# Altium schematic symbol library jlcpcb_2025_04_capacitors_extended_0805.schlib: 3281 symbols (part 11 of 18) (continued)
## CGA4J2X7R2A104KT0Y0U
designator C?  Capacitance: 100nF  (hidden comment: *)
Capacitor, Ceramic (MLCC), 100nF, ±10%, 100V, X7R, ±10%, SMD 0805; Manufacturer: TDK; Manufacturer Part Number: CGA4J2X7R2A104KT0Y0U; Package Size: 0805; JLCPCB Basic Part: No; JLCPCB Part Number: C342919; Supplier 1: LCSC; Category: Capacitors - MLCC; Supplier Part Number 1: C342919; Tolerance: ±10%; Voltage Rating: 100V; Temperature Coefficient: X7R; RoHS: Yes; ComponentLink1Description: Datasheet; ComponentLink1URL: https://wmsc.lcsc.com/wmsc/upload/file/pdf/v2/lcsc/2304140030_TDK-CGA4J2X7R2A104KT0Y0U_C342919.pdf; ComponentLink2Description: JLCPCB Part URL; ComponentLink2URL: https://jlcpcb.com/partdetail/C342919; ComponentLink3Description: LCSC Part URL; ComponentLink3URL: https://lcsc.com/product-detail/Multilayer-Ceramic-Capacitors-MLCC---SMD-SMT_TDK-TDK-CGA4J2X7R2A104KT0Y0U_C342919.html
footprint CAP-0805 (0805 (2012M) Capacitor)
pins: 1, 2

## CGA4J2X7R2A223KT0Y0U
designator C?  Capacitance: 22nF  (hidden comment: *)
Capacitor, Ceramic (MLCC), 22nF, ±10%, 100V, X7R, ±10%, SMD 0805; Manufacturer: TDK; Manufacturer Part Number: CGA4J2X7R2A223KT0Y0U; Package Size: 0805; JLCPCB Basic Part: No; JLCPCB Part Number: C338065; Supplier 1: LCSC; Category: Capacitors - MLCC; Supplier Part Number 1: C338065; Tolerance: ±10%; Voltage Rating: 100V; Temperature Coefficient: X7R; RoHS: Yes; ComponentLink1Description: Datasheet; ComponentLink1URL: https://wmsc.lcsc.com/wmsc/upload/file/pdf/v2/lcsc/2304140030_TDK-CGA4J2X7R2A223KT0Y0U_C338065.pdf; ComponentLink2Description: JLCPCB Part URL; ComponentLink2URL: https://jlcpcb.com/partdetail/C338065; ComponentLink3Description: LCSC Part URL; ComponentLink3URL: https://lcsc.com/product-detail/Multilayer-Ceramic-Capacitors-MLCC---SMD-SMT_TDK-TDK-CGA4J2X7R2A223KT0Y0U_C338065.html
footprint CAP-0805 (0805 (2012M) Capacitor)
pins: 1, 2

## CGA4J2X7R2A473KT0Y0U
designator C?  Capacitance: 47nF  (hidden comment: *)
Capacitor, Ceramic (MLCC), 47nF, ±10%, 100V, X7R, ±10%, SMD 0805; Manufacturer: TDK; Manufacturer Part Number: CGA4J2X7R2A473KT0Y0U; Package Size: 0805; JLCPCB Basic Part: No; JLCPCB Part Number: C342887; Supplier 1: LCSC; Category: Capacitors - MLCC; Supplier Part Number 1: C342887; Tolerance: ±10%; Voltage Rating: 100V; Temperature Coefficient: X7R; RoHS: Yes; ComponentLink1Description: Datasheet; ComponentLink1URL: https://wmsc.lcsc.com/wmsc/upload/file/pdf/v2/lcsc/2304140030_TDK-CGA4J2X7R2A473KT0Y0U_C342887.pdf; ComponentLink2Description: JLCPCB Part URL; ComponentLink2URL: https://jlcpcb.com/partdetail/C342887; ComponentLink3Description: LCSC Part URL; ComponentLink3URL: https://lcsc.com/product-detail/Multilayer-Ceramic-Capacitors-MLCC---SMD-SMT_TDK-TDK-CGA4J2X7R2A473KT0Y0U_C342887.html
footprint CAP-0805 (0805 (2012M) Capacitor)
pins: 1, 2

## CGA4J2X8R1H104KT0Y0H
designator C?  Capacitance: 100nF  (hidden comment: *)
Capacitor, Ceramic (MLCC), 100nF, ±10%, 50V, X8R, ±10%, SMD 0805; Manufacturer: TDK; Manufacturer Part Number: CGA4J2X8R1H104KT0Y0H; Package Size: 0805; JLCPCB Basic Part: No; JLCPCB Part Number: C342862; Supplier 1: LCSC; Category: Capacitors - MLCC; Supplier Part Number 1: C342862; Tolerance: ±10%; Voltage Rating: 50V; Temperature Coefficient: X8R; RoHS: Yes; ComponentLink1Description: Datasheet; ComponentLink1URL: https://wmsc.lcsc.com/wmsc/upload/file/pdf/v2/lcsc/2304140030_TDK-CGA4J2X8R1H104KT0Y0H_C342862.pdf; ComponentLink2Description: JLCPCB Part URL; ComponentLink2URL: https://jlcpcb.com/partdetail/C342862; ComponentLink3Description: LCSC Part URL; ComponentLink3URL: https://lcsc.com/product-detail/Multilayer-Ceramic-Capacitors-MLCC---SMD-SMT_TDK-TDK-CGA4J2X8R1H104KT0Y0H_C342862.html
footprint CAP-0805 (0805 (2012M) Capacitor)
pins: 1, 2

## CGA4J3C0G2E103JT0Y0N
designator C?  Capacitance: 10nF  (hidden comment: *)
Capacitor, Ceramic (MLCC), 10nF, ±5%, 250V, C0G, ±5%, SMD 0805; Manufacturer: TDK; Manufacturer Part Number: CGA4J3C0G2E103JT0Y0N; Package Size: 0805; JLCPCB Basic Part: No; JLCPCB Part Number: C193080; Supplier 1: LCSC; Category: Capacitors - MLCC; Supplier Part Number 1: C193080; Tolerance: ±5%; Voltage Rating: 250V; Temperature Coefficient: C0G; RoHS: Yes; ComponentLink1Description: Datasheet; ComponentLink1URL: https://wmsc.lcsc.com/wmsc/upload/file/pdf/v2/lcsc/2304140030_TDK-CGA4J3C0G2E103JT0Y0N_C193080.pdf; ComponentLink2Description: JLCPCB Part URL; ComponentLink2URL: https://jlcpcb.com/partdetail/C193080; ComponentLink3Description: LCSC Part URL; ComponentLink3URL: https://lcsc.com/product-detail/Multilayer-Ceramic-Capacitors-MLCC---SMD-SMT_TDK-TDK-CGA4J3C0G2E103JT0Y0N_C193080.html
footprint CAP-0805 (0805 (2012M) Capacitor)
pins: 1, 2

## CGA4J3C0G2E222JT0Y0N
designator C?  Capacitance: 2.2nF  (hidden comment: *)
Capacitor, Ceramic (MLCC), 2.2nF, ±5%, 250V, C0G, ±5%, SMD 0805; Manufacturer: TDK; Manufacturer Part Number: CGA4J3C0G2E222JT0Y0N; Package Size: 0805; JLCPCB Basic Part: No; JLCPCB Part Number: C694233; Supplier 1: LCSC; Category: Capacitors - MLCC; Supplier Part Number 1: C694233; Tolerance: ±5%; Voltage Rating: 250V; Temperature Coefficient: C0G; RoHS: Yes; ComponentLink1Description: Datasheet; ComponentLink1URL: https://wmsc.lcsc.com/wmsc/upload/file/pdf/v2/lcsc/2304140030_TDK-CGA4J3C0G2E222JT0Y0N_C694233.pdf; ComponentLink2Description: JLCPCB Part URL; ComponentLink2URL: https://jlcpcb.com/partdetail/C694233; ComponentLink3Description: LCSC Part URL; ComponentLink3URL: https://lcsc.com/product-detail/Multilayer-Ceramic-Capacitors-MLCC---SMD-SMT_TDK-TDK-CGA4J3C0G2E222JT0Y0N_C694233.html
footprint CAP-0805 (0805 (2012M) Capacitor)
pins: 1, 2

## CGA4J3C0G2E472JT0Y0N
designator C?  Capacitance: 4.7nF  (hidden comment: *)
Capacitor, Ceramic (MLCC), 4.7nF, ±5%, 250V, C0G, ±5%, SMD 0805; Manufacturer: TDK; Manufacturer Part Number: CGA4J3C0G2E472JT0Y0N; Package Size: 0805; JLCPCB Basic Part: No; JLCPCB Part Number: C415305; Supplier 1: LCSC; Category: Capacitors - MLCC; Supplier Part Number 1: C415305; Tolerance: ±5%; Voltage Rating: 250V; Temperature Coefficient: C0G; RoHS: Yes; ComponentLink1Description: Datasheet; ComponentLink1URL: https://wmsc.lcsc.com/wmsc/upload/file/pdf/v2/lcsc/2304140030_TDK-CGA4J3C0G2E472JT0Y0N_C415305.pdf; ComponentLink2Description: JLCPCB Part URL; ComponentLink2URL: https://jlcpcb.com/partdetail/C415305; ComponentLink3Description: LCSC Part URL; ComponentLink3URL: https://lcsc.com/product-detail/Multilayer-Ceramic-Capacitors-MLCC---SMD-SMT_TDK-TDK-CGA4J3C0G2E472JT0Y0N_C415305.html
footprint CAP-0805 (0805 (2012M) Capacitor)
pins: 1, 2

## CGA4J3C0G2E682JT0Y0N
designator C?  Capacitance: 6.8nF  (hidden comment: *)
Capacitor, Ceramic (MLCC), 6.8nF, ±5%, 250V, null, ±5%, SMD 0805; Manufacturer: TDK; Manufacturer Part Number: CGA4J3C0G2E682JT0Y0N; Package Size: 0805; JLCPCB Basic Part: No; JLCPCB Part Number: C5213809; Supplier 1: LCSC; Category: Capacitors - MLCC; Supplier Part Number 1: C5213809; Tolerance: ±5%; Voltage Rating: 250V; Temperature Coefficient: null; RoHS: Yes; ComponentLink1Description: Datasheet; ComponentLink1URL: https://wmsc.lcsc.com/wmsc/upload/file/pdf/v2/lcsc/2210261730_TDK-CGA4J3C0G2E682JT0Y0N_C5213809.pdf; ComponentLink2Description: JLCPCB Part URL; ComponentLink2URL: https://jlcpcb.com/partdetail/C5213809; ComponentLink3Description: LCSC Part URL; ComponentLink3URL: https://lcsc.com/product-detail/Multilayer-Ceramic-Capacitors-MLCC---SMD-SMT_TDK-TDK-CGA4J3C0G2E682JT0Y0N_C5213809.html
footprint CAP-0805 (0805 (2012M) Capacitor)
pins: 1, 2

## CGA4J3X5R1A106KT0Y0N
designator C?  Capacitance: 10uF  (hidden comment: *)
Capacitor, Ceramic (MLCC), 10uF, ±10%, 10V, X5R, ±10%, SMD 0805; Manufacturer: TDK; Manufacturer Part Number: CGA4J3X5R1A106KT0Y0N; Package Size: 0805; JLCPCB Basic Part: No; JLCPCB Part Number: C193117; Supplier 1: LCSC; Category: Capacitors - MLCC; Supplier Part Number 1: C193117; Tolerance: ±10%; Voltage Rating: 10V; Temperature Coefficient: X5R; RoHS: Yes; ComponentLink1Description: Datasheet; ComponentLink1URL: https://wmsc.lcsc.com/wmsc/upload/file/pdf/v2/lcsc/2304140030_TDK-CGA4J3X5R1A106KT0Y0N_C193117.pdf; ComponentLink2Description: JLCPCB Part URL; ComponentLink2URL: https://jlcpcb.com/partdetail/C193117; ComponentLink3Description: LCSC Part URL; ComponentLink3URL: https://lcsc.com/product-detail/Multilayer-Ceramic-Capacitors-MLCC---SMD-SMT_TDK-TDK-CGA4J3X5R1A106KT0Y0N_C193117.html
footprint CAP-0805 (0805 (2012M) Capacitor)
pins: 1, 2

## CGA4J3X5R1E225KT0Y0N
designator C?  Capacitance: 2.2uF  (hidden comment: *)
Capacitor, Ceramic (MLCC), 2.2uF, ±10%, 25V, ±10%, SMD 0805; Manufacturer: TDK; Manufacturer Part Number: CGA4J3X5R1E225KT0Y0N; Package Size: 0805; JLCPCB Basic Part: No; JLCPCB Part Number: C2838753; Supplier 1: LCSC; Category: Capacitors - MLCC; Supplier Part Number 1: C2838753; Tolerance: ±10%; Voltage Rating: 25V; RoHS: Yes; ComponentLink1Description: Datasheet; ComponentLink1URL: https://wmsc.lcsc.com/wmsc/upload/file/pdf/v2/lcsc/2108071730_TDK-CGA4J3X5R1E225KT0Y0N_C2838753.pdf; ComponentLink2Description: JLCPCB Part URL; ComponentLink2URL: https://jlcpcb.com/partdetail/C2838753; ComponentLink3Description: LCSC Part URL; ComponentLink3URL: https://lcsc.com/product-detail/Multilayer-Ceramic-Capacitors-MLCC---SMD-SMT_TDK-TDK-CGA4J3X5R1E225KT0Y0N_C2838753.html
footprint CAP-0805 (0805 (2012M) Capacitor)
pins: 1, 2

## CGA4J3X5R1E475KT0Y0N
designator C?  Capacitance: 4.7uF  (hidden comment: *)
Capacitor, Ceramic (MLCC), 4.7uF, ±10%, 25V, X5R, ±10%, SMD 0805; Manufacturer: TDK; Manufacturer Part Number: CGA4J3X5R1E475KT0Y0N; Package Size: 0805; JLCPCB Basic Part: No; JLCPCB Part Number: C193078; Supplier 1: LCSC; Category: Capacitors - MLCC; Supplier Part Number 1: C193078; Tolerance: ±10%; Voltage Rating: 25V; Temperature Coefficient: X5R; RoHS: Yes; ComponentLink1Description: Datasheet; ComponentLink1URL: https://wmsc.lcsc.com/wmsc/upload/file/pdf/v2/lcsc/2304140030_TDK-CGA4J3X5R1E475KT0Y0N_C193078.pdf; ComponentLink2Description: JLCPCB Part URL; ComponentLink2URL: https://jlcpcb.com/partdetail/C193078; ComponentLink3Description: LCSC Part URL; ComponentLink3URL: https://lcsc.com/product-detail/Multilayer-Ceramic-Capacitors-MLCC---SMD-SMT_TDK-TDK-CGA4J3X5R1E475KT0Y0N_C193078.html
footprint CAP-0805 (0805 (2012M) Capacitor)
pins: 1, 2

## CGA4J3X5R1H335KT0Y0N
designator C?  Capacitance: 3.3uF  (hidden comment: *)
Capacitor, Ceramic (MLCC), 3.3uF, ±10%, 50V, X5R, ±10%, SMD 0805; Manufacturer: TDK; Manufacturer Part Number: CGA4J3X5R1H335KT0Y0N; Package Size: 0805; JLCPCB Basic Part: No; JLCPCB Part Number: C2939047; Supplier 1: LCSC; Category: Capacitors - MLCC; Supplier Part Number 1: C2939047; Tolerance: ±10%; Voltage Rating: 50V; Temperature Coefficient: X5R; RoHS: Yes; ComponentLink1Description: Datasheet; ComponentLink1URL: https://wmsc.lcsc.com/wmsc/upload/file/pdf/v2/lcsc/2201121830_TDK-CGA4J3X5R1H335KT0Y0N_C2939047.pdf; ComponentLink2Description: JLCPCB Part URL; ComponentLink2URL: https://jlcpcb.com/partdetail/C2939047; ComponentLink3Description: LCSC Part URL; ComponentLink3URL: https://lcsc.com/product-detail/Multilayer-Ceramic-Capacitors-MLCC---SMD-SMT_TDK-TDK-CGA4J3X5R1H335KT0Y0N_C2939047.html
footprint CAP-0805 (0805 (2012M) Capacitor)
pins: 1, 2

## CGA4J3X5R1H475KT0Y0N
designator C?  Capacitance: 4.7uF  (hidden comment: *)
Capacitor, Ceramic (MLCC), 4.7uF, ±10%, 50V, X5R, ±10%, SMD 0805; Manufacturer: TDK; Manufacturer Part Number: CGA4J3X5R1H475KT0Y0N; Package Size: 0805; JLCPCB Basic Part: No; JLCPCB Part Number: C329962; Supplier 1: LCSC; Category: Capacitors - MLCC; Supplier Part Number 1: C329962; Tolerance: ±10%; Voltage Rating: 50V; Temperature Coefficient: X5R; RoHS: Yes; ComponentLink1Description: Datasheet; ComponentLink1URL: https://wmsc.lcsc.com/wmsc/upload/file/pdf/v2/lcsc/2304140030_TDK-CGA4J3X5R1H475KT0Y0N_C329962.pdf; ComponentLink2Description: JLCPCB Part URL; ComponentLink2URL: https://jlcpcb.com/partdetail/C329962; ComponentLink3Description: LCSC Part URL; ComponentLink3URL: https://lcsc.com/product-detail/Multilayer-Ceramic-Capacitors-MLCC---SMD-SMT_TDK-TDK-CGA4J3X5R1H475KT0Y0N_C329962.html
footprint CAP-0805 (0805 (2012M) Capacitor)
pins: 1, 2

## CGA4J3X7R1A475KT0Y0N
designator C?  Capacitance: 4.7uF  (hidden comment: *)
Capacitor, Ceramic (MLCC), 4.7uF, ±10%, 10V, X7R, ±10%, SMD 0805; Manufacturer: TDK; Manufacturer Part Number: CGA4J3X7R1A475KT0Y0N; Package Size: 0805; JLCPCB Basic Part: No; JLCPCB Part Number: C193119; Supplier 1: LCSC; Category: Capacitors - MLCC; Supplier Part Number 1: C193119; Tolerance: ±10%; Voltage Rating: 10V; Temperature Coefficient: X7R; RoHS: Yes; ComponentLink1Description: Datasheet; ComponentLink1URL: https://wmsc.lcsc.com/wmsc/upload/file/pdf/v2/lcsc/2304140030_TDK-CGA4J3X7R1A475KT0Y0N_C193119.pdf; ComponentLink2Description: JLCPCB Part URL; ComponentLink2URL: https://jlcpcb.com/partdetail/C193119; ComponentLink3Description: LCSC Part URL; ComponentLink3URL: https://lcsc.com/product-detail/Multilayer-Ceramic-Capacitors-MLCC---SMD-SMT_TDK-TDK-CGA4J3X7R1A475KT0Y0N_C193119.html
footprint CAP-0805 (0805 (2012M) Capacitor)
pins: 1, 2

## CGA4J3X7R1C225K125AB
designator C?  Capacitance: 2.2uF  (hidden comment: *)
Capacitor, Ceramic (MLCC), 2.2uF, ±10%, 16V, X7R, ±10%, SMD 0805; Manufacturer: TDK; Manufacturer Part Number: CGA4J3X7R1C225K125AB; Package Size: 0805; JLCPCB Basic Part: No; JLCPCB Part Number: C183896; Supplier 1: LCSC; Category: Capacitors - MLCC; Supplier Part Number 1: C183896; Tolerance: ±10%; Voltage Rating: 16V; Temperature Coefficient: X7R; RoHS: Yes; ComponentLink1Description: Datasheet; ComponentLink1URL: https://wmsc.lcsc.com/wmsc/upload/file/pdf/v2/lcsc/2304140030_TDK-CGA4J3X7R1C225K125AB_C183896.pdf; ComponentLink2Description: JLCPCB Part URL; ComponentLink2URL: https://jlcpcb.com/partdetail/C183896; ComponentLink3Description: LCSC Part URL; ComponentLink3URL: https://lcsc.com/product-detail/Multilayer-Ceramic-Capacitors-MLCC---SMD-SMT_TDK-TDK-CGA4J3X7R1C225K125AB_C183896.html
footprint CAP-0805 (0805 (2012M) Capacitor)
pins: 1, 2

## CGA4J3X7R1C225KT0Y0N
designator C?  Capacitance: 2.2uF  (hidden comment: *)
Capacitor, Ceramic (MLCC), 2.2uF, ±10%, 16V, X7R, ±10%, SMD 0805; Manufacturer: TDK; Manufacturer Part Number: CGA4J3X7R1C225KT0Y0N; Package Size: 0805; JLCPCB Basic Part: No; JLCPCB Part Number: C338060; Supplier 1: LCSC; Category: Capacitors - MLCC; Supplier Part Number 1: C338060; Tolerance: ±10%; Voltage Rating: 16V; Temperature Coefficient: X7R; RoHS: Yes; ComponentLink1Description: Datasheet; ComponentLink1URL: https://wmsc.lcsc.com/wmsc/upload/file/pdf/v2/lcsc/2304140030_TDK-CGA4J3X7R1C225KT0Y0N_C338060.pdf; ComponentLink2Description: JLCPCB Part URL; ComponentLink2URL: https://jlcpcb.com/partdetail/C338060; ComponentLink3Description: LCSC Part URL; ComponentLink3URL: https://lcsc.com/product-detail/Multilayer-Ceramic-Capacitors-MLCC---SMD-SMT_TDK-TDK-CGA4J3X7R1C225KT0Y0N_C338060.html
footprint CAP-0805 (0805 (2012M) Capacitor)
pins: 1, 2

## CGA4J3X7R1C335KT0Y0N
designator C?  Capacitance: 3.3uF  (hidden comment: *)
Capacitor, Ceramic (MLCC), 3.3uF, ±10%, 16V, X7R, ±10%, SMD 0805; Manufacturer: TDK; Manufacturer Part Number: CGA4J3X7R1C335KT0Y0N; Package Size: 0805; JLCPCB Basic Part: No; JLCPCB Part Number: C415306; Supplier 1: LCSC; Category: Capacitors - MLCC; Supplier Part Number 1: C415306; Tolerance: ±10%; Voltage Rating: 16V; Temperature Coefficient: X7R; RoHS: Yes; ComponentLink1Description: Datasheet; ComponentLink1URL: https://wmsc.lcsc.com/wmsc/upload/file/pdf/v2/lcsc/2304140030_TDK-CGA4J3X7R1C335KT0Y0N_C415306.pdf; ComponentLink2Description: JLCPCB Part URL; ComponentLink2URL: https://jlcpcb.com/partdetail/C415306; ComponentLink3Description: LCSC Part URL; ComponentLink3URL: https://lcsc.com/product-detail/Multilayer-Ceramic-Capacitors-MLCC---SMD-SMT_TDK-TDK-CGA4J3X7R1C335KT0Y0N_C415306.html
footprint CAP-0805 (0805 (2012M) Capacitor)
pins: 1, 2

## CGA4J3X7R1C475KT0Y0N
designator C?  Capacitance: 4.7uF  (hidden comment: *)
Capacitor, Ceramic (MLCC), 4.7uF, ±10%, 16V, X7R, ±10%, SMD 0805; Manufacturer: TDK; Manufacturer Part Number: CGA4J3X7R1C475KT0Y0N; Package Size: 0805; JLCPCB Basic Part: No; JLCPCB Part Number: C342757; Supplier 1: LCSC; Category: Capacitors - MLCC; Supplier Part Number 1: C342757; Tolerance: ±10%; Voltage Rating: 16V; Temperature Coefficient: X7R; RoHS: Yes; ComponentLink1Description: Datasheet; ComponentLink1URL: https://wmsc.lcsc.com/wmsc/upload/file/pdf/v2/lcsc/2304140030_TDK-CGA4J3X7R1C475KT0Y0N_C342757.pdf; ComponentLink2Description: JLCPCB Part URL; ComponentLink2URL: https://jlcpcb.com/partdetail/C342757; ComponentLink3Description: LCSC Part URL; ComponentLink3URL: https://lcsc.com/product-detail/Multilayer-Ceramic-Capacitors-MLCC---SMD-SMT_TDK-TDK-CGA4J3X7R1C475KT0Y0N_C342757.html
footprint CAP-0805 (0805 (2012M) Capacitor)
pins: 1, 2

## CGA4J3X7R1C475KT0Y0S
designator C?  Capacitance: 4.7uF  (hidden comment: *)
Capacitor, Ceramic (MLCC), 4.7uF, ±10%, 16V, X7R, ±10%, SMD 0805; Manufacturer: TDK; Manufacturer Part Number: CGA4J3X7R1C475KT0Y0S; Package Size: 0805; JLCPCB Basic Part: No; JLCPCB Part Number: C415307; Supplier 1: LCSC; Category: Capacitors - MLCC; Supplier Part Number 1: C415307; Tolerance: ±10%; Voltage Rating: 16V; Temperature Coefficient: X7R; RoHS: Yes; ComponentLink1Description: Datasheet; ComponentLink1URL: https://wmsc.lcsc.com/wmsc/upload/file/pdf/v2/lcsc/2304140030_TDK-CGA4J3X7R1C475KT0Y0S_C415307.pdf; ComponentLink2Description: JLCPCB Part URL; ComponentLink2URL: https://jlcpcb.com/partdetail/C415307; ComponentLink3Description: LCSC Part URL; ComponentLink3URL: https://lcsc.com/product-detail/Multilayer-Ceramic-Capacitors-MLCC---SMD-SMT_TDK-TDK-CGA4J3X7R1C475KT0Y0S_C415307.html
footprint CAP-0805 (0805 (2012M) Capacitor)
pins: 1, 2

## CGA4J3X7R1E105KT0Y0N
designator C?  Capacitance: 1uF  (hidden comment: *)
Capacitor, Ceramic (MLCC), 1uF, ±10%, 25V, X7R, ±10%, SMD 0805; Manufacturer: TDK; Manufacturer Part Number: CGA4J3X7R1E105KT0Y0N; Package Size: 0805; JLCPCB Basic Part: No; JLCPCB Part Number: C342927; Supplier 1: LCSC; Category: Capacitors - MLCC; Supplier Part Number 1: C342927; Tolerance: ±10%; Voltage Rating: 25V; Temperature Coefficient: X7R; RoHS: Yes; ComponentLink1Description: Datasheet; ComponentLink1URL: https://wmsc.lcsc.com/wmsc/upload/file/pdf/v2/lcsc/2304140030_TDK-CGA4J3X7R1E105KT0Y0N_C342927.pdf; ComponentLink2Description: JLCPCB Part URL; ComponentLink2URL: https://jlcpcb.com/partdetail/C342927; ComponentLink3Description: LCSC Part URL; ComponentLink3URL: https://lcsc.com/product-detail/Multilayer-Ceramic-Capacitors-MLCC---SMD-SMT_TDK-TDK-CGA4J3X7R1E105KT0Y0N_C342927.html
footprint CAP-0805 (0805 (2012M) Capacitor)
pins: 1, 2

## CGA4J3X7R1E225KT0Y0N
designator C?  Capacitance: 2.2uF  (hidden comment: *)
Capacitor, Ceramic (MLCC), 2.2uF, ±10%, 25V, X7R, ±10%, SMD 0805; Manufacturer: TDK; Manufacturer Part Number: CGA4J3X7R1E225KT0Y0N; Package Size: 0805; JLCPCB Basic Part: No; JLCPCB Part Number: C76714; Supplier 1: LCSC; Category: Capacitors - MLCC; Supplier Part Number 1: C76714; Tolerance: ±10%; Voltage Rating: 25V; Temperature Coefficient: X7R; RoHS: Yes; ComponentLink1Description: Datasheet; ComponentLink1URL: https://wmsc.lcsc.com/wmsc/upload/file/pdf/v2/lcsc/2304140030_TDK-CGA4J3X7R1E225KT0Y0N_C76714.pdf; ComponentLink2Description: JLCPCB Part URL; ComponentLink2URL: https://jlcpcb.com/partdetail/C76714; ComponentLink3Description: LCSC Part URL; ComponentLink3URL: https://lcsc.com/product-detail/Multilayer-Ceramic-Capacitors-MLCC---SMD-SMT_TDK-TDK-CGA4J3X7R1E225KT0Y0N_C76714.html
footprint CAP-0805 (0805 (2012M) Capacitor)
pins: 1, 2

## CGA4J3X7R1E684KT0Y0N
designator C?  Capacitance: 680nF  (hidden comment: *)
Capacitor, Ceramic (MLCC), 680nF, ±10%, 25V, X7R, ±10%, SMD 0805; Manufacturer: TDK; Manufacturer Part Number: CGA4J3X7R1E684KT0Y0N; Package Size: 0805; JLCPCB Basic Part: No; JLCPCB Part Number: C360358; Supplier 1: LCSC; Category: Capacitors - MLCC; Supplier Part Number 1: C360358; Tolerance: ±10%; Voltage Rating: 25V; Temperature Coefficient: X7R; RoHS: Yes; ComponentLink1Description: Datasheet; ComponentLink1URL: https://wmsc.lcsc.com/wmsc/upload/file/pdf/v2/lcsc/2304140030_TDK-CGA4J3X7R1E684KT0Y0N_C360358.pdf; ComponentLink2Description: JLCPCB Part URL; ComponentLink2URL: https://jlcpcb.com/partdetail/C360358; ComponentLink3Description: LCSC Part URL; ComponentLink3URL: https://lcsc.com/product-detail/Multilayer-Ceramic-Capacitors-MLCC---SMD-SMT_TDK-TDK-CGA4J3X7R1E684KT0Y0N_C360358.html
footprint CAP-0805 (0805 (2012M) Capacitor)
pins: 1, 2

## CGA4J3X7R1H105KT0Y0N
designator C?  Capacitance: 1uF  (hidden comment: *)
Capacitor, Ceramic (MLCC), 1uF, ±10%, 50V, X7R, ±10%, SMD 0805; Manufacturer: TDK; Manufacturer Part Number: CGA4J3X7R1H105KT0Y0N; Package Size: 0805; JLCPCB Basic Part: No; JLCPCB Part Number: C342759; Supplier 1: LCSC; Category: Capacitors - MLCC; Supplier Part Number 1: C342759; Tolerance: ±10%; Voltage Rating: 50V; Temperature Coefficient: X7R; RoHS: Yes; ComponentLink1Description: Datasheet; ComponentLink1URL: https://wmsc.lcsc.com/wmsc/upload/file/pdf/v2/lcsc/2304140030_TDK-CGA4J3X7R1H105KT0Y0N_C342759.pdf; ComponentLink2Description: JLCPCB Part URL; ComponentLink2URL: https://jlcpcb.com/partdetail/C342759; ComponentLink3Description: LCSC Part URL; ComponentLink3URL: https://lcsc.com/product-detail/Multilayer-Ceramic-Capacitors-MLCC---SMD-SMT_TDK-TDK-CGA4J3X7R1H105KT0Y0N_C342759.html
footprint CAP-0805 (0805 (2012M) Capacitor)
pins: 1, 2

## CGA4J3X7R1H225KT000N
designator C?  Capacitance: 2.2uF  (hidden comment: *)
Capacitor, Ceramic (MLCC), 2.2uF, ±10%, 50V, X7R, ±10%, SMD 0805; Manufacturer: TDK; Manufacturer Part Number: CGA4J3X7R1H225KT000N; Package Size: 0805; JLCPCB Basic Part: No; JLCPCB Part Number: C342737; Supplier 1: LCSC; Category: Capacitors - MLCC; Supplier Part Number 1: C342737; Tolerance: ±10%; Voltage Rating: 50V; Temperature Coefficient: X7R; RoHS: Yes; ComponentLink1Description: Datasheet; ComponentLink1URL: https://wmsc.lcsc.com/wmsc/upload/file/pdf/v2/lcsc/2304140030_TDK-CGA4J3X7R1H225KT000N_C342737.pdf; ComponentLink2Description: JLCPCB Part URL; ComponentLink2URL: https://jlcpcb.com/partdetail/C342737; ComponentLink3Description: LCSC Part URL; ComponentLink3URL: https://lcsc.com/product-detail/Multilayer-Ceramic-Capacitors-MLCC---SMD-SMT_TDK-TDK-CGA4J3X7R1H225KT000N_C342737.html
footprint CAP-0805 (0805 (2012M) Capacitor)
pins: 1, 2

## CGA4J3X7R1H474KT0Y0N
designator C?  Capacitance: 470nF  (hidden comment: *)
Capacitor, Ceramic (MLCC), 470nF, ±10%, 50V, X7R, ±10%, SMD 0805; Manufacturer: TDK; Manufacturer Part Number: CGA4J3X7R1H474KT0Y0N; Package Size: 0805; JLCPCB Basic Part: No; JLCPCB Part Number: C342804; Supplier 1: LCSC; Category: Capacitors - MLCC; Supplier Part Number 1: C342804; Tolerance: ±10%; Voltage Rating: 50V; Temperature Coefficient: X7R; RoHS: Yes; ComponentLink1Description: Datasheet; ComponentLink1URL: https://wmsc.lcsc.com/wmsc/upload/file/pdf/v2/lcsc/2304140030_TDK-CGA4J3X7R1H474KT0Y0N_C342804.pdf; ComponentLink2Description: JLCPCB Part URL; ComponentLink2URL: https://jlcpcb.com/partdetail/C342804; ComponentLink3Description: LCSC Part URL; ComponentLink3URL: https://lcsc.com/product-detail/Multilayer-Ceramic-Capacitors-MLCC---SMD-SMT_TDK-TDK-CGA4J3X7R1H474KT0Y0N_C342804.html
footprint CAP-0805 (0805 (2012M) Capacitor)
pins: 1, 2

## CGA4J3X7R1H474KT0Y0S
designator C?  Capacitance: 470nF  (hidden comment: *)
Capacitor, Ceramic (MLCC), 470nF, ±10%, 50V, X7R, ±10%, SMD 0805; Manufacturer: TDK; Manufacturer Part Number: CGA4J3X7R1H474KT0Y0S; Package Size: 0805; JLCPCB Basic Part: No; JLCPCB Part Number: C415308; Supplier 1: LCSC; Category: Capacitors - MLCC; Supplier Part Number 1: C415308; Tolerance: ±10%; Voltage Rating: 50V; Temperature Coefficient: X7R; RoHS: Yes; ComponentLink1Description: Datasheet; ComponentLink1URL: https://wmsc.lcsc.com/wmsc/upload/file/pdf/v2/lcsc/1912111437_TDK-CGA4J3X7R1H474KT0Y0S_C415308.pdf; ComponentLink2Description: JLCPCB Part URL; ComponentLink2URL: https://jlcpcb.com/partdetail/C415308; ComponentLink3Description: LCSC Part URL; ComponentLink3URL: https://lcsc.com/product-detail/Multilayer-Ceramic-Capacitors-MLCC---SMD-SMT_TDK-TDK-CGA4J3X7R1H474KT0Y0S_C415308.html
footprint CAP-0805 (0805 (2012M) Capacitor)
pins: 1, 2

## CGA4J3X7R1H684KT0Y0N
designator C?  Capacitance: 680nF  (hidden comment: *)
Capacitor, Ceramic (MLCC), 680nF, ±10%, 50V, X7R, ±10%, SMD 0805; Manufacturer: TDK; Manufacturer Part Number: CGA4J3X7R1H684KT0Y0N; Package Size: 0805; JLCPCB Basic Part: No; JLCPCB Part Number: C342764; Supplier 1: LCSC; Category: Capacitors - MLCC; Supplier Part Number 1: C342764; Tolerance: ±10%; Voltage Rating: 50V; Temperature Coefficient: X7R; RoHS: Yes; ComponentLink1Description: Datasheet; ComponentLink1URL: https://wmsc.lcsc.com/wmsc/upload/file/pdf/v2/lcsc/2304140030_TDK-CGA4J3X7R1H684KT0Y0N_C342764.pdf; ComponentLink2Description: JLCPCB Part URL; ComponentLink2URL: https://jlcpcb.com/partdetail/C342764; ComponentLink3Description: LCSC Part URL; ComponentLink3URL: https://lcsc.com/product-detail/Multilayer-Ceramic-Capacitors-MLCC---SMD-SMT_TDK-TDK-CGA4J3X7R1H684KT0Y0N_C342764.html
footprint CAP-0805 (0805 (2012M) Capacitor)
pins: 1, 2

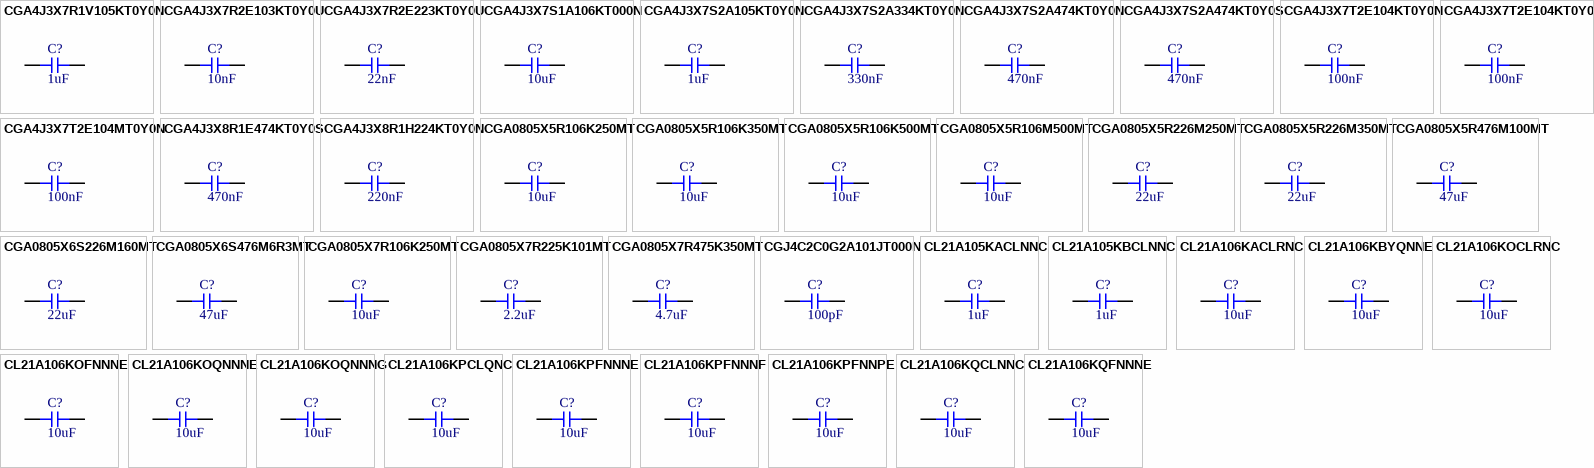
[diagram p48: symbols CGA4J3X7R1V105KT0Y0N to CL21A106KQFNNNE]

## CGA4J3X7R1V105KT0Y0N
designator C?  Capacitance: 1uF  (hidden comment: *)
Capacitor, Ceramic (MLCC), 1uF, ±10%, 35V, X7R, ±10%, SMD 0805; Manufacturer: TDK; Manufacturer Part Number: CGA4J3X7R1V105KT0Y0N; Package Size: 0805; JLCPCB Basic Part: No; JLCPCB Part Number: C361185; Supplier 1: LCSC; Category: Capacitors - MLCC; Supplier Part Number 1: C361185; Tolerance: ±10%; Voltage Rating: 35V; Temperature Coefficient: X7R; RoHS: Yes; ComponentLink1Description: Datasheet; ComponentLink1URL: https://wmsc.lcsc.com/wmsc/upload/file/pdf/v2/lcsc/1912111437_TDK-CGA4J3X7R1V105KT0Y0N_C361185.pdf; ComponentLink2Description: JLCPCB Part URL; ComponentLink2URL: https://jlcpcb.com/partdetail/C361185; ComponentLink3Description: LCSC Part URL; ComponentLink3URL: https://lcsc.com/product-detail/Multilayer-Ceramic-Capacitors-MLCC---SMD-SMT_TDK-TDK-CGA4J3X7R1V105KT0Y0N_C361185.html
footprint CAP-0805 (0805 (2012M) Capacitor)
pins: 1, 2

## CGA4J3X7R2E103KT0Y0U
designator C?  Capacitance: 10nF  (hidden comment: *)
Capacitor, Ceramic (MLCC), 10nF, ±10%, 250V, X7R, ±10%, SMD 0805; Manufacturer: TDK; Manufacturer Part Number: CGA4J3X7R2E103KT0Y0U; Package Size: 0805; JLCPCB Basic Part: No; JLCPCB Part Number: C432946; Supplier 1: LCSC; Category: Capacitors - MLCC; Supplier Part Number 1: C432946; Tolerance: ±10%; Voltage Rating: 250V; Temperature Coefficient: X7R; RoHS: Yes; ComponentLink1Description: Datasheet; ComponentLink1URL: https://wmsc.lcsc.com/wmsc/upload/file/pdf/v2/lcsc/2304140030_TDK-CGA4J3X7R2E103KT0Y0U_C432946.pdf; ComponentLink2Description: JLCPCB Part URL; ComponentLink2URL: https://jlcpcb.com/partdetail/C432946; ComponentLink3Description: LCSC Part URL; ComponentLink3URL: https://lcsc.com/product-detail/Multilayer-Ceramic-Capacitors-MLCC---SMD-SMT_TDK-TDK-CGA4J3X7R2E103KT0Y0U_C432946.html
footprint CAP-0805 (0805 (2012M) Capacitor)
pins: 1, 2

## CGA4J3X7R2E223KT0Y0U
designator C?  Capacitance: 22nF  (hidden comment: *)
Capacitor, Ceramic (MLCC), 22nF, ±10%, 250V, X7R, ±10%, SMD 0805; Manufacturer: TDK; Manufacturer Part Number: CGA4J3X7R2E223KT0Y0U; Package Size: 0805; JLCPCB Basic Part: No; JLCPCB Part Number: C694511; Supplier 1: LCSC; Category: Capacitors - MLCC; Supplier Part Number 1: C694511; Tolerance: ±10%; Voltage Rating: 250V; Temperature Coefficient: X7R; RoHS: Yes; ComponentLink1Description: Datasheet; ComponentLink1URL: https://wmsc.lcsc.com/wmsc/upload/file/pdf/v2/lcsc/2304140030_TDK-CGA4J3X7R2E223KT0Y0U_C694511.pdf; ComponentLink2Description: JLCPCB Part URL; ComponentLink2URL: https://jlcpcb.com/partdetail/C694511; ComponentLink3Description: LCSC Part URL; ComponentLink3URL: https://lcsc.com/product-detail/Multilayer-Ceramic-Capacitors-MLCC---SMD-SMT_TDK-TDK-CGA4J3X7R2E223KT0Y0U_C694511.html
footprint CAP-0805 (0805 (2012M) Capacitor)
pins: 1, 2

## CGA4J3X7S1A106KT000N
designator C?  Capacitance: 10uF  (hidden comment: *)
Capacitor, Ceramic (MLCC), 10uF, ±10%, 10V, X7S, ±10%, SMD 0805; Manufacturer: TDK; Manufacturer Part Number: CGA4J3X7S1A106KT000N; Package Size: 0805; JLCPCB Basic Part: No; JLCPCB Part Number: C342720; Supplier 1: LCSC; Category: Capacitors - MLCC; Supplier Part Number 1: C342720; Tolerance: ±10%; Voltage Rating: 10V; Temperature Coefficient: X7S; RoHS: Yes; ComponentLink1Description: Datasheet; ComponentLink1URL: https://wmsc.lcsc.com/wmsc/upload/file/pdf/v2/lcsc/2304140030_TDK-CGA4J3X7S1A106KT000N_C342720.pdf; ComponentLink2Description: JLCPCB Part URL; ComponentLink2URL: https://jlcpcb.com/partdetail/C342720; ComponentLink3Description: LCSC Part URL; ComponentLink3URL: https://lcsc.com/product-detail/Multilayer-Ceramic-Capacitors-MLCC---SMD-SMT_TDK-TDK-CGA4J3X7S1A106KT000N_C342720.html
footprint CAP-0805 (0805 (2012M) Capacitor)
pins: 1, 2

## CGA4J3X7S2A105KT0Y0N
designator C?  Capacitance: 1uF  (hidden comment: *)
Capacitor, Ceramic (MLCC), 1uF, ±10%, 100V, X7S, ±10%, SMD 0805; Manufacturer: TDK; Manufacturer Part Number: CGA4J3X7S2A105KT0Y0N; Package Size: 0805; JLCPCB Basic Part: No; JLCPCB Part Number: C338074; Supplier 1: LCSC; Category: Capacitors - MLCC; Supplier Part Number 1: C338074; Tolerance: ±10%; Voltage Rating: 100V; Temperature Coefficient: X7S; RoHS: Yes; ComponentLink1Description: Datasheet; ComponentLink1URL: https://wmsc.lcsc.com/wmsc/upload/file/pdf/v2/lcsc/2304140030_TDK-CGA4J3X7S2A105KT0Y0N_C338074.pdf; ComponentLink2Description: JLCPCB Part URL; ComponentLink2URL: https://jlcpcb.com/partdetail/C338074; ComponentLink3Description: LCSC Part URL; ComponentLink3URL: https://lcsc.com/product-detail/Multilayer-Ceramic-Capacitors-MLCC---SMD-SMT_TDK-TDK-CGA4J3X7S2A105KT0Y0N_C338074.html
footprint CAP-0805 (0805 (2012M) Capacitor)
pins: 1, 2

## CGA4J3X7S2A334KT0Y0N
designator C?  Capacitance: 330nF  (hidden comment: *)
Capacitor, Ceramic (MLCC), 330nF, ±10%, 100V, X7S, ±10%, SMD 0805; Manufacturer: TDK; Manufacturer Part Number: CGA4J3X7S2A334KT0Y0N; Package Size: 0805; JLCPCB Basic Part: No; JLCPCB Part Number: C338109; Supplier 1: LCSC; Category: Capacitors - MLCC; Supplier Part Number 1: C338109; Tolerance: ±10%; Voltage Rating: 100V; Temperature Coefficient: X7S; RoHS: Yes; ComponentLink1Description: Datasheet; ComponentLink1URL: https://wmsc.lcsc.com/wmsc/upload/file/pdf/v2/lcsc/2304140030_TDK-CGA4J3X7S2A334KT0Y0N_C338109.pdf; ComponentLink2Description: JLCPCB Part URL; ComponentLink2URL: https://jlcpcb.com/partdetail/C338109; ComponentLink3Description: LCSC Part URL; ComponentLink3URL: https://lcsc.com/product-detail/Multilayer-Ceramic-Capacitors-MLCC---SMD-SMT_TDK-TDK-CGA4J3X7S2A334KT0Y0N_C338109.html
footprint CAP-0805 (0805 (2012M) Capacitor)
pins: 1, 2

## CGA4J3X7S2A474KT0Y0N
designator C?  Capacitance: 470nF  (hidden comment: *)
Capacitor, Ceramic (MLCC), 470nF, ±10%, 100V, X7S, ±10%, SMD 0805; Manufacturer: TDK; Manufacturer Part Number: CGA4J3X7S2A474KT0Y0N; Package Size: 0805; JLCPCB Basic Part: No; JLCPCB Part Number: C342736; Supplier 1: LCSC; Category: Capacitors - MLCC; Supplier Part Number 1: C342736; Tolerance: ±10%; Voltage Rating: 100V; Temperature Coefficient: X7S; RoHS: Yes; ComponentLink1Description: Datasheet; ComponentLink1URL: https://wmsc.lcsc.com/wmsc/upload/file/pdf/v2/lcsc/2304140030_TDK-CGA4J3X7S2A474KT0Y0N_C342736.pdf; ComponentLink2Description: JLCPCB Part URL; ComponentLink2URL: https://jlcpcb.com/partdetail/C342736; ComponentLink3Description: LCSC Part URL; ComponentLink3URL: https://lcsc.com/product-detail/Multilayer-Ceramic-Capacitors-MLCC---SMD-SMT_TDK-TDK-CGA4J3X7S2A474KT0Y0N_C342736.html
footprint CAP-0805 (0805 (2012M) Capacitor)
pins: 1, 2

## CGA4J3X7S2A474KT0Y0S
designator C?  Capacitance: 470nF  (hidden comment: *)
Capacitor, Ceramic (MLCC), 470nF, ±10%, 100V, X7S, ±10%, SMD 0805; Manufacturer: TDK; Manufacturer Part Number: CGA4J3X7S2A474KT0Y0S; Package Size: 0805; JLCPCB Basic Part: No; JLCPCB Part Number: C880708; Supplier 1: LCSC; Category: Capacitors - MLCC; Supplier Part Number 1: C880708; Tolerance: ±10%; Voltage Rating: 100V; Temperature Coefficient: X7S; RoHS: Yes; ComponentLink1Description: Datasheet; ComponentLink1URL: https://wmsc.lcsc.com/wmsc/upload/file/pdf/v2/lcsc/2010192207_TDK-CGA4J3X7S2A474KT0Y0S_C880708.pdf; ComponentLink2Description: JLCPCB Part URL; ComponentLink2URL: https://jlcpcb.com/partdetail/C880708; ComponentLink3Description: LCSC Part URL; ComponentLink3URL: https://lcsc.com/product-detail/Multilayer-Ceramic-Capacitors-MLCC---SMD-SMT_TDK-TDK-CGA4J3X7S2A474KT0Y0S_C880708.html
footprint CAP-0805 (0805 (2012M) Capacitor)
pins: 1, 2

## CGA4J3X7T2E104KT0Y0N
designator C?  Capacitance: 100nF  (hidden comment: *)
Capacitor, Ceramic (MLCC), 100nF, 250V, X7T, SMD 0805; Manufacturer: TDK; Manufacturer Part Number: CGA4J3X7T2E104KT0Y0N; Package Size: 0805; JLCPCB Basic Part: No; JLCPCB Part Number: C5119329; Supplier 1: LCSC; Category: Capacitors - MLCC; Supplier Part Number 1: C5119329; Voltage Rating: 250V; Temperature Coefficient: X7T; RoHS: Yes; ComponentLink1Description: Datasheet; ComponentLink1URL: https://wmsc.lcsc.com/wmsc/upload/file/pdf/v2/lcsc/2207261800_TDK-CGA4J3X7T2E104KT0Y0N_C5119329.pdf; ComponentLink2Description: JLCPCB Part URL; ComponentLink2URL: https://jlcpcb.com/partdetail/C5119329; ComponentLink3Description: LCSC Part URL; ComponentLink3URL: https://lcsc.com/product-detail/Multilayer-Ceramic-Capacitors-MLCC---SMD-SMT_TDK-TDK-CGA4J3X7T2E104KT0Y0N_C5119329.html
footprint CAP-0805 (0805 (2012M) Capacitor)
pins: 1, 2

## CGA4J3X7T2E104KT0Y0S
designator C?  Capacitance: 100nF  (hidden comment: *)
Capacitor, Ceramic (MLCC), 100nF, ±10%, 250V, X7T, ±10%, SMD 0805; Manufacturer: TDK; Manufacturer Part Number: CGA4J3X7T2E104KT0Y0S; Package Size: 0805; JLCPCB Basic Part: No; JLCPCB Part Number: C445706; Supplier 1: LCSC; Category: Capacitors - MLCC; Supplier Part Number 1: C445706; Tolerance: ±10%; Voltage Rating: 250V; Temperature Coefficient: X7T; RoHS: Yes; ComponentLink1Description: Datasheet; ComponentLink1URL: https://wmsc.lcsc.com/wmsc/upload/file/pdf/v2/lcsc/2304140030_TDK-CGA4J3X7T2E104KT0Y0S_C445706.pdf; ComponentLink2Description: JLCPCB Part URL; ComponentLink2URL: https://jlcpcb.com/partdetail/C445706; ComponentLink3Description: LCSC Part URL; ComponentLink3URL: https://lcsc.com/product-detail/Multilayer-Ceramic-Capacitors-MLCC---SMD-SMT_TDK-TDK-CGA4J3X7T2E104KT0Y0S_C445706.html
footprint CAP-0805 (0805 (2012M) Capacitor)
pins: 1, 2

## CGA4J3X7T2E104MT0Y0N
designator C?  Capacitance: 100nF  (hidden comment: *)
Capacitor, Ceramic (MLCC), 100nF, 250V, X7T, SMD 0805; Manufacturer: TDK; Manufacturer Part Number: CGA4J3X7T2E104MT0Y0N; Package Size: 0805; JLCPCB Basic Part: No; JLCPCB Part Number: C2680660; Supplier 1: LCSC; Category: Capacitors - MLCC; Supplier Part Number 1: C2680660; Voltage Rating: 250V; Temperature Coefficient: X7T; RoHS: Yes; ComponentLink1Description: Datasheet; ComponentLink1URL: https://wmsc.lcsc.com/wmsc/upload/file/pdf/v2/lcsc/2106070536_TDK-CGA4J3X7T2E104MT0Y0N_C2680660.pdf; ComponentLink2Description: JLCPCB Part URL; ComponentLink2URL: https://jlcpcb.com/partdetail/C2680660; ComponentLink3Description: LCSC Part URL; ComponentLink3URL: https://lcsc.com/product-detail/Multilayer-Ceramic-Capacitors-MLCC---SMD-SMT_TDK-TDK-CGA4J3X7T2E104MT0Y0N_C2680660.html
footprint CAP-0805 (0805 (2012M) Capacitor)
pins: 1, 2

## CGA4J3X8R1E474KT0Y0S
designator C?  Capacitance: 470nF  (hidden comment: *)
Capacitor, Ceramic (MLCC), 470nF, ±10%, 25V, X8R, ±10%, SMD 0805; Manufacturer: TDK; Manufacturer Part Number: CGA4J3X8R1E474KT0Y0S; Package Size: 0805; JLCPCB Basic Part: No; JLCPCB Part Number: C2847625; Supplier 1: LCSC; Category: Capacitors - MLCC; Supplier Part Number 1: C2847625; Tolerance: ±10%; Voltage Rating: 25V; Temperature Coefficient: X8R; RoHS: Yes; ComponentLink1Description: Datasheet; ComponentLink1URL: https://wmsc.lcsc.com/wmsc/upload/file/pdf/v2/lcsc/2108171930_TDK-CGA4J3X8R1E474KT0Y0S_C2847625.pdf; ComponentLink2Description: JLCPCB Part URL; ComponentLink2URL: https://jlcpcb.com/partdetail/C2847625; ComponentLink3Description: LCSC Part URL; ComponentLink3URL: https://lcsc.com/product-detail/Multilayer-Ceramic-Capacitors-MLCC---SMD-SMT_TDK-TDK-CGA4J3X8R1E474KT0Y0S_C2847625.html
footprint CAP-0805 (0805 (2012M) Capacitor)
pins: 1, 2

## CGA4J3X8R1H224KT0Y0N
designator C?  Capacitance: 220nF  (hidden comment: *)
Capacitor, Ceramic (MLCC), 220nF, ±10%, 50V, X8R, ±10%, SMD 0805; Manufacturer: TDK; Manufacturer Part Number: CGA4J3X8R1H224KT0Y0N; Package Size: 0805; JLCPCB Basic Part: No; JLCPCB Part Number: C342747; Supplier 1: LCSC; Category: Capacitors - MLCC; Supplier Part Number 1: C342747; Tolerance: ±10%; Voltage Rating: 50V; Temperature Coefficient: X8R; RoHS: Yes; ComponentLink1Description: Datasheet; ComponentLink1URL: https://wmsc.lcsc.com/wmsc/upload/file/pdf/v2/lcsc/2304140030_TDK-CGA4J3X8R1H224KT0Y0N_C342747.pdf; ComponentLink2Description: JLCPCB Part URL; ComponentLink2URL: https://jlcpcb.com/partdetail/C342747; ComponentLink3Description: LCSC Part URL; ComponentLink3URL: https://lcsc.com/product-detail/Multilayer-Ceramic-Capacitors-MLCC---SMD-SMT_TDK-TDK-CGA4J3X8R1H224KT0Y0N_C342747.html
footprint CAP-0805 (0805 (2012M) Capacitor)
pins: 1, 2

## CGA0805X5R106K250MT
designator C?  Capacitance: 10uF  (hidden comment: *)
Capacitor, Ceramic (MLCC), 10uF, ±10%, 25V, X5R, ±10%, SMD 0805; Manufacturer: HRE; Manufacturer Part Number: CGA0805X5R106K250MT; Package Size: 0805; JLCPCB Basic Part: No; JLCPCB Part Number: C6119887; Supplier 1: LCSC; Category: Capacitors - MLCC; Supplier Part Number 1: C6119887; Tolerance: ±10%; Voltage Rating: 25V; Temperature Coefficient: X5R; RoHS: Yes; ComponentLink1Description: Datasheet; ComponentLink2Description: JLCPCB Part URL; ComponentLink2URL: https://jlcpcb.com/partdetail/C6119887; ComponentLink3Description: LCSC Part URL; ComponentLink3URL: https://lcsc.com/product-detail/Multilayer-Ceramic-Capacitors-MLCC---SMD-SMT_HRE-HRE-CGA0805X5R106K250MT_C6119887.html
footprint CAP-0805 (0805 (2012M) Capacitor)
pins: 1, 2

## CGA0805X5R106K350MT
designator C?  Capacitance: 10uF  (hidden comment: *)
Capacitor, Ceramic (MLCC), 10uF, ±10%, 35V, X5R, ±10%, SMD 0805; Manufacturer: HRE; Manufacturer Part Number: CGA0805X5R106K350MT; Package Size: 0805; JLCPCB Basic Part: No; JLCPCB Part Number: C6119888; Supplier 1: LCSC; Category: Capacitors - MLCC; Supplier Part Number 1: C6119888; Tolerance: ±10%; Voltage Rating: 35V; Temperature Coefficient: X5R; RoHS: Yes; ComponentLink1Description: Datasheet; ComponentLink2Description: JLCPCB Part URL; ComponentLink2URL: https://jlcpcb.com/partdetail/C6119888; ComponentLink3Description: LCSC Part URL; ComponentLink3URL: https://lcsc.com/product-detail/Multilayer-Ceramic-Capacitors-MLCC---SMD-SMT_HRE-HRE-CGA0805X5R106K350MT_C6119888.html
footprint CAP-0805 (0805 (2012M) Capacitor)
pins: 1, 2

## CGA0805X5R106K500MT
designator C?  Capacitance: 10uF  (hidden comment: *)
Capacitor, Ceramic (MLCC), 10uF, ±10%, null, X5R, ±10%, SMD 0805; Manufacturer: HRE; Manufacturer Part Number: CGA0805X5R106K500MT; Package Size: 0805; JLCPCB Basic Part: No; JLCPCB Part Number: C6119889; Supplier 1: LCSC; Category: Capacitors - MLCC; Supplier Part Number 1: C6119889; Tolerance: ±10%; Voltage Rating: null; Temperature Coefficient: X5R; RoHS: Yes; ComponentLink1Description: Datasheet; ComponentLink2Description: JLCPCB Part URL; ComponentLink2URL: https://jlcpcb.com/partdetail/C6119889; ComponentLink3Description: LCSC Part URL; ComponentLink3URL: https://lcsc.com/product-detail/Multilayer-Ceramic-Capacitors-MLCC---SMD-SMT_HRE-HRE-CGA0805X5R106K500MT_C6119889.html
footprint CAP-0805 (0805 (2012M) Capacitor)
pins: 1, 2

## CGA0805X5R106M500MT
designator C?  Capacitance: 10uF  (hidden comment: *)
Capacitor, Ceramic (MLCC), 10uF, ±20%, null, X5R, ±20%, SMD 0805; Manufacturer: HRE; Manufacturer Part Number: CGA0805X5R106M500MT; Package Size: 0805; JLCPCB Basic Part: No; JLCPCB Part Number: C6119892; Supplier 1: LCSC; Category: Capacitors - MLCC; Supplier Part Number 1: C6119892; Tolerance: ±20%; Voltage Rating: null; Temperature Coefficient: X5R; RoHS: Yes; ComponentLink1Description: Datasheet; ComponentLink2Description: JLCPCB Part URL; ComponentLink2URL: https://jlcpcb.com/partdetail/C6119892; ComponentLink3Description: LCSC Part URL; ComponentLink3URL: https://lcsc.com/product-detail/Multilayer-Ceramic-Capacitors-MLCC---SMD-SMT_HRE-HRE-CGA0805X5R106M500MT_C6119892.html
footprint CAP-0805 (0805 (2012M) Capacitor)
pins: 1, 2

## CGA0805X5R226M250MT
designator C?  Capacitance: 22uF  (hidden comment: *)
Capacitor, Ceramic (MLCC), 22uF, ±20%, 25V, X5R, ±20%, SMD 0805; Manufacturer: HRE; Manufacturer Part Number: CGA0805X5R226M250MT; Package Size: 0805; JLCPCB Basic Part: No; JLCPCB Part Number: C6119899; Supplier 1: LCSC; Category: Capacitors - MLCC; Supplier Part Number 1: C6119899; Tolerance: ±20%; Voltage Rating: 25V; Temperature Coefficient: X5R; RoHS: Yes; ComponentLink1Description: Datasheet; ComponentLink2Description: JLCPCB Part URL; ComponentLink2URL: https://jlcpcb.com/partdetail/C6119899; ComponentLink3Description: LCSC Part URL; ComponentLink3URL: https://lcsc.com/product-detail/Multilayer-Ceramic-Capacitors-MLCC---SMD-SMT_HRE-HRE-CGA0805X5R226M250MT_C6119899.html
footprint CAP-0805 (0805 (2012M) Capacitor)
pins: 1, 2

## CGA0805X5R226M350MT
designator C?  Capacitance: 22uF  (hidden comment: *)
Capacitor, Ceramic (MLCC), 22uF, ±20%, 35V, X5R, ±20%, SMD 0805; Manufacturer: HRE; Manufacturer Part Number: CGA0805X5R226M350MT; Package Size: 0805; JLCPCB Basic Part: No; JLCPCB Part Number: C6119901; Supplier 1: LCSC; Category: Capacitors - MLCC; Supplier Part Number 1: C6119901; Tolerance: ±20%; Voltage Rating: 35V; Temperature Coefficient: X5R; RoHS: Yes; ComponentLink1Description: Datasheet; ComponentLink1URL: https://wmsc.lcsc.com/wmsc/upload/file/pdf/v2/lcsc/2403281426_HRE-CGA0805X5R226M350MT_C6119901.pdf; ComponentLink2Description: JLCPCB Part URL; ComponentLink2URL: https://jlcpcb.com/partdetail/C6119901; ComponentLink3Description: LCSC Part URL; ComponentLink3URL: https://lcsc.com/product-detail/Multilayer-Ceramic-Capacitors-MLCC---SMD-SMT_HRE-HRE-CGA0805X5R226M350MT_C6119901.html
footprint CAP-0805 (0805 (2012M) Capacitor)
pins: 1, 2
